# Altium footprint library Module's & Board's.PcbLib: 19 footprints (part 2 of 2)
Each footprint in its own frame and in the unit in brackets; x right, y up, seen from the top. Pads: shape width x height; smd on the part's side, far side on the other; paste and mask are expansions set on the pad; w line width, h text height; cw(c..) or ccw(c..) is an arc to the next point about the centre after c.
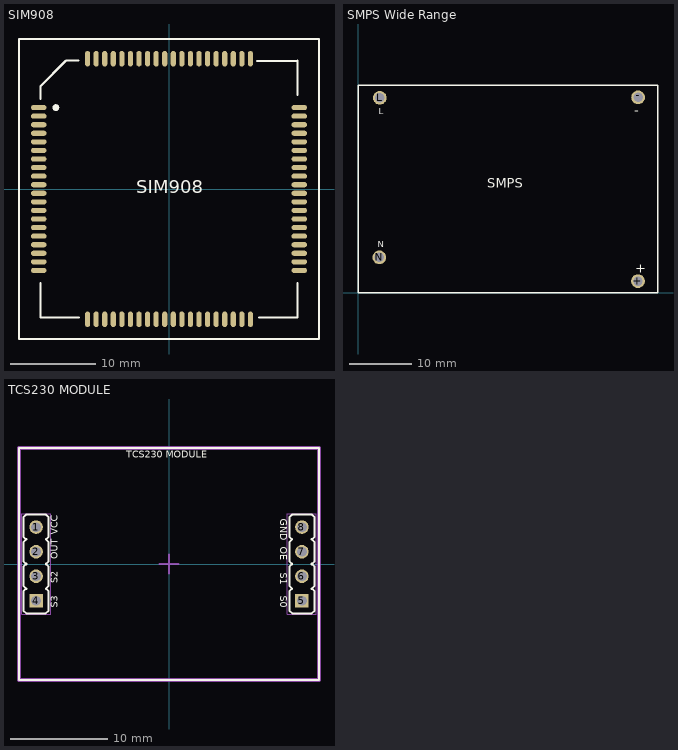
[diagram p1: the footprints below, top view; thin cyan lines are the x and y axes]

## SIM908 [mm]
pads (81):
  round 0.8 on Top Overlay: 0(-13.193,9.5)
  oval 1.8x0.6 smd: 1(-15.2,9.5) 2(-15.2,8.5) 3(-15.2,7.5) 4(-15.2,6.5) 5(-15.2,5.5) 6(-15.2,4.5) 7(-15.2,3.5) 8(-15.2,2.5) 9(-15.2,1.5) 10(-15.2,0.5) 11(-15.2,-0.5) 12(-15.2,-1.5) 13(-15.2,-2.5) 14(-15.2,-3.5) 15(-15.2,-4.5) 16(-15.2,-5.5) 17(-15.2,-6.5) 18(-15.2,-7.5) 19(-15.2,-8.5) 20(-15.2,-9.5) 41(15.2,-9.5) 42(15.2,-8.5) 43(15.2,-7.5) 44(15.2,-6.5) 45(15.2,-5.5) 46(15.2,-4.5) 47(15.2,-3.5) 48(15.2,-2.5) 49(15.2,-1.5) 50(15.2,-0.5) 51(15.2,0.5) 52(15.2,1.5) 53(15.2,2.5) 54(15.2,3.5) 55(15.2,4.5) 56(15.2,5.5) 57(15.2,6.5) 58(15.2,7.5) 59(15.2,8.5) 60(15.2,9.5)
  oval 0.6x1.8 smd: 21(-9.5,-15.2) 22(-8.5,-15.2) 23(-7.5,-15.2) 24(-6.5,-15.2) 25(-5.5,-15.2) 26(-4.5,-15.2) 27(-3.5,-15.2) 28(-2.5,-15.2) 29(-1.5,-15.2) 30(-0.5,-15.2) 31(0.5,-15.2) 32(1.5,-15.2) 33(2.5,-15.2) 34(3.5,-15.2) 35(4.5,-15.2) 36(5.5,-15.2) 37(6.5,-15.2) 38(7.5,-15.2) 39(8.5,-15.2) 40(9.5,-15.2) 61(9.5,15.2) 62(8.5,15.2) 63(7.5,15.2) 64(6.5,15.2) 65(5.5,15.2) 66(4.5,15.2) 67(3.5,15.2) 68(2.5,15.2) 69(1.5,15.2) 70(0.5,15.2) 71(-0.5,15.2) 72(-1.5,15.2) 73(-2.5,15.2) 74(-3.5,15.2) 75(-4.5,15.2) 76(-5.5,15.2) 77(-6.5,15.2) 78(-7.5,15.2) 79(-8.5,15.2) 80(-9.5,15.2)
Top Overlay:
  lines w0.254: -15,-11 -15,-15 -10.5,-15 ; -15,10.5 -15,12 -12.076,14.924 -12,14.924 -12,15 -10.576,15 ; 10.298,14.924 14.924,14.924 ; 10.5,-15 15,-15 15,-11 ; 14.924,17.5 17.5,17.5 17.5,-17.5 -17.5,-17.5 -17.5,17.5 15,17.5 ; 15,11 15,15
  text "SIM908" at -3.81,-0.508 h1.52
3D body "User Library-SIM908.STEP": height 3.09, standoff -0.11, extent -14.968,-15.042 15.032,14.958

## SMPS Wide Range [mm]
pads (4):
  round 2.2 hole 1.5: +(44.7,1.825) -(44.725,31.175) L(3.475,31.1) N(3.4,5.625)
Top Overlay:
  lines w0.203: 0,0 47.9,0 47.9,33.075 0,33.075 0,0
  text "SMPS" at 20.65,16.725 h1.52
  text "L" at 3.325,28.5 h1.02
  text "N" at 3.125,7.2 h1.02
  text "-" at 44.125,28.425 h1.52
  text "+" at 44.275,3.15 h1.52
3D body "Wide Range SMPS 12V-1A.step": height 28.67, standoff -5.78, extent 0.025,0.025 47.875,33.075

## TCS230 MODULE [mm] "DESIGNER ABBAS BASEREH"
height 1.4
pads (8):
  round 1.4 / inner round 1.4 / far side oval 2.2x1.4 hole 1 mask+0.1: 1(-13.737,3.81) 2(-13.737,1.27) 3(-13.737,-1.27) 6(13.738,-1.27) 7(13.738,1.27) 8(13.738,3.81)
  rect 1.4x1.4 / inner rect 1.4x1.4 / far side rect 2.2x1.4 hole 1 mask+0.1: 4(-13.737,-3.81) 5(13.738,-3.81)
Top Overlay:
  lines w0.2: -14.737,-2.57 -15.037,-2.27 -15.037,-0.27 -14.737,0.03 ; -14.737,-2.51 -15.037,-2.81 -15.037,-4.81 -14.737,-5.11 -12.737,-5.11 -12.437,-4.81 -12.437,-2.81 -12.737,-2.51 ; -14.737,-0.03 -15.037,0.27 -15.037,2.27 -14.737,2.57 ; -14.737,2.515 -15.037,2.815 -15.037,4.815 -14.737,5.115 -12.737,5.115 -12.437,4.815 -12.437,2.815 -12.737,2.515 ; -12.737,-2.57 -12.437,-2.27 -12.437,-0.27 -12.737,0.03 ; -12.737,-0.03 -12.437,0.27 -12.437,2.27 -12.737,2.57 ; 12.738,-2.57 12.438,-2.27 12.438,-0.27 12.738,0.03 ; 12.738,-2.51 12.438,-2.81 12.438,-4.81 12.738,-5.11 14.738,-5.11 15.038,-4.81 15.038,-2.81 14.738,-2.51 ; 12.738,-0.03 12.438,0.27 12.438,2.27 12.738,2.57 ; 12.738,2.515 12.438,2.815 12.438,4.815 12.738,5.115 14.738,5.115 15.038,4.815 15.038,2.815 14.738,2.515 ; 14.738,-2.57 15.038,-2.27 15.038,-0.27 14.738,0.03 ; 14.738,-0.03 15.038,0.27 15.038,2.27 14.738,2.57 ; -15.5,-12 15.5,-12 15.5,12 -15.5,12 -15.5,-12
  text "TCS230 MODULE" at -4.4,11 h0.7
  text "VCC" at -11.5,3 h0.7
  text "OUT" at -11.5,0.5 h0.7
  text "S2" at -11.5,-2 h0.7
  text "S3" at -11.5,-4.5 h0.7
  text "GND" at 11.5,4.7 h0.7
  text "OE" at 11.5,1.8 h0.7
  text "S1" at 11.5,-0.9 h0.7
  text "S0" at 11.5,-3.3 h0.7
Mechanical 15:
  lines w0.1: -15.237,-5.21 -15.237,5.215 -12.237,5.215 -12.237,-5.21 -15.237,-5.21 ; 12.238,-5.21 15.238,-5.21 15.238,5.215 12.238,5.215 12.238,-5.21
  lines w0.2: -1,0 1,0 ; 0,-1 0,1
  lines w0.4: -15.5,-12 15.5,-12 15.5,12 -15.5,12 -15.5,-12
3D body "User Library-Header_Male_4Pin.STEP": height 8.54, standoff -3, extent -15.007,-5.08 -12.518,5.08
3D body "User Library-Header_Male_4Pin.STEP": height 8.54, standoff -3, extent 12.468,-5.08 14.957,5.08